# Altium footprint library 04.连接器件.pcb.PCBLIB: 363 footprints (part 21 of 23)
Each footprint in its own frame and in the unit in brackets; x right, y up, seen from the top. Pads: shape width x height; smd on the part's side, far side on the other; paste and mask are expansions set on the pad; w line width, h text height; cw(c..) or ccw(c..) is an arc to the next point about the centre after c.
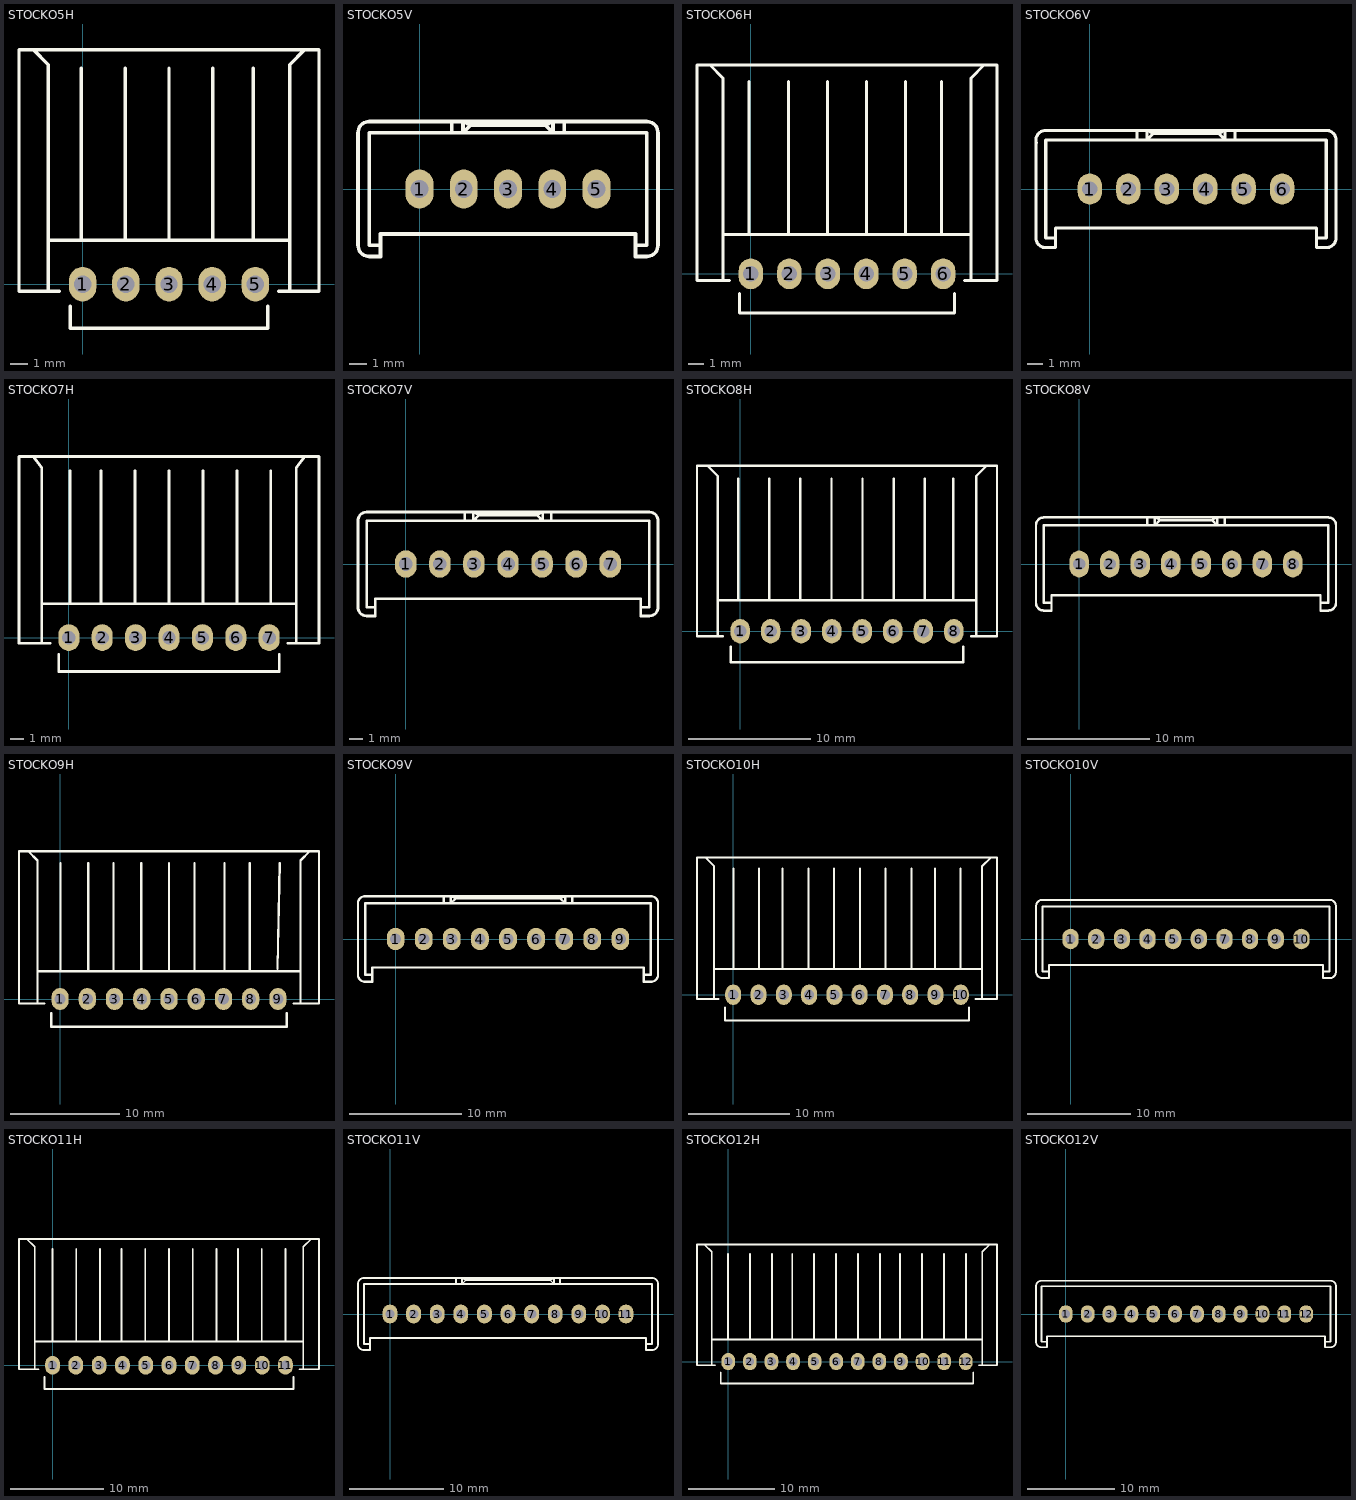
[diagram p20: the footprints below, top view; thin cyan lines are the x and y axes]

## STOCKO5H [mm]
pads (5):
  oval 1.575x2 hole 1: 1(0,0) 2(2.498,0) 3(4.995,0) 4(7.493,0) 5(9.991,0)
TopOverlay:
  lines w0.2: -2.836,13.547 -1.99,12.7 -1.99,-0.423 ; -1.99,2.54 11.98,2.54 ; -1.355,-0.423 -3.683,-0.423 -3.683,13.547 13.674,13.547 13.674,-0.423 11.345,-0.423 ; -0.72,-1.27 -0.72,-2.54 10.71,-2.54 10.71,-1.27 ; -0.085,2.54 -0.085,12.488 ; 2.455,2.54 2.455,12.488 ; 4.995,2.54 4.995,12.488 ; 7.535,2.54 7.535,12.488 ; 9.864,2.54 9.864,12.488 ; 11.98,-0.423 11.98,12.7 12.827,13.547

## STOCKO5V [mm]
pads (5):
  oval 1.575x2.2 hole 1: 1(0,0) 2(2.498,0) 3(4.995,0) 4(7.493,0) 5(9.991,0)
TopOverlay:
  lines w0.2: -2.201,-3.175 -2.836,-3.175 -2.836,3.175 12.827,3.175 12.827,-3.175 12.192,-3.175 ; 1.82,3.175 1.82,3.81 ; 8.17,3.175 8.17,3.81 ; 2.879,3.598 2.455,3.175 2.455,3.81 2.879,3.598 ; 2.879,3.598 7.112,3.598 ; 7.112,3.598 7.535,3.175 7.535,3.81 7.112,3.598 ; -3.471,-3.175 ccw(c-2.836,-3.175) -2.836,-3.81 -2.201,-3.81 -2.201,-2.54 12.192,-2.54 12.192,-3.81 12.827,-3.81 ccw(c12.827,-3.175) 13.462,-3.175 13.462,3.175 ccw(c12.827,3.175) 12.827,3.81 -2.836,3.81 ccw(c-2.836,3.175) -3.471,3.175 -3.471,-3.175

## STOCKO6H [mm]
pads (6):
  oval 1.575x2 hole 1: 1(0,0) 2(2.498,0) 3(4.995,0) 4(7.493,0) 5(9.991,0) 6(12.488,0)
TopOverlay:
  lines w0.2: -2.646,13.547 -1.799,12.7 -1.799,-0.423 ; -1.799,2.54 14.287,2.54 ; -1.376,-0.423 -3.492,-0.423 -3.492,13.547 15.981,13.547 15.981,-0.423 13.864,-0.423 ; -0.741,-1.27 -0.741,-2.54 13.229,-2.54 13.229,-1.27 ; -0.106,2.54 -0.106,12.488 ; 2.434,2.54 2.434,12.488 ; 4.974,2.54 4.974,12.488 ; 7.514,2.54 7.514,12.488 ; 10.054,2.54 10.054,12.488 ; 12.382,2.54 12.382,12.488 ; 14.287,-0.423 14.287,12.7 15.134,13.547

## STOCKO6V [mm]
pads (6):
  oval 1.575x2 hole 1: 1(0,0) 2(2.498,0) 3(4.995,0) 4(7.493,0) 5(9.991,0) 6(12.488,0)
TopOverlay:
  lines w0.2: -3.492,3.175 -3.492,-3.175 ccw(c-2.857,-3.175) -2.857,-3.81 -2.222,-3.81 -2.222,-2.54 14.711,-2.54 14.711,-3.81 15.346,-3.81 ccw(c15.346,-3.175) 15.981,-3.175 15.981,3.175 ccw(c15.346,3.175) 15.346,3.81 -2.857,3.81 ccw(c-2.857,3.175) -3.461,2.979 ; -2.222,-3.175 -2.857,-3.175 -2.857,3.175 15.346,3.175 15.346,-3.175 14.711,-3.175 ; 3.069,3.175 3.069,3.81 ; 9.419,3.175 9.419,3.81 ; 4.127,3.598 3.704,3.81 3.704,3.175 4.127,3.598 ; 4.127,3.598 8.361,3.598 ; 8.361,3.598 8.784,3.81 8.784,3.175 8.361,3.598

## STOCKO7H [mm]
pads (7):
  oval 1.575x2 hole 1: 1(0,0) 2(2.498,0) 3(4.995,0) 4(7.493,0) 5(9.991,0) 6(12.488,0) 7(14.986,0)
TopOverlay:
  lines w0.2: -2.667,13.547 -2.032,12.7 -2.032,-0.423 ; -2.032,2.54 17.018,2.54 ; -1.397,-0.423 -3.725,-0.423 -3.725,13.547 18.711,13.547 18.711,-0.423 16.383,-0.423 ; -0.762,-1.27 -0.762,-2.54 15.748,-2.54 15.748,-1.27 ; 0.085,2.54 0.085,12.488 ; 2.413,2.54 2.413,12.488 ; 4.953,2.54 4.953,12.488 ; 7.493,2.54 7.493,12.488 ; 10.033,2.54 10.033,12.488 ; 12.573,2.54 12.573,12.488 ; 15.113,2.54 15.113,12.488 ; 17.018,-0.423 17.018,12.7 17.653,13.547

## STOCKO7V [mm]
pads (7):
  oval 1.575x2 hole 1: 1(0,0) 2(2.498,0) 3(4.995,0) 4(7.493,0) 5(9.991,0) 6(12.488,0) 7(14.986,0)
TopOverlay:
  lines w0.2: -2.244,-3.175 -2.879,-3.175 -2.879,3.175 17.865,3.175 17.865,-3.175 17.23,-3.175 ; 4.318,3.175 4.318,3.81 ; 10.668,3.175 10.668,3.81 ; 5.376,3.598 4.953,3.175 4.953,3.81 5.376,3.598 ; 5.376,3.598 9.61,3.598 ; 9.61,3.598 10.033,3.175 10.033,3.81 9.61,3.598 ; -3.514,-3.175 ccw(c-2.879,-3.175) -2.879,-3.81 -2.244,-3.81 -2.244,-2.54 17.23,-2.54 17.23,-3.81 17.865,-3.81 ccw(c17.865,-3.175) 18.5,-3.175 18.5,3.175 ccw(c17.865,3.175) 17.865,3.81 -2.879,3.81 ccw(c-2.879,3.175) -3.514,3.175 -3.514,-3.175

## STOCKO8H [mm]
pads (8):
  oval 1.575x2 hole 1: 1(0,0) 2(2.498,0) 3(4.995,0) 4(7.493,0) 5(9.991,0) 6(12.488,0) 7(14.986,0) 8(17.484,0)
TopOverlay:
  lines w0.2: -2.688,13.547 -1.841,12.7 -1.841,-0.423 ; -1.841,2.54 19.325,2.54 ; -1.418,-0.423 -3.535,-0.423 -3.535,13.547 21.018,13.547 21.018,-0.423 18.902,-0.423 ; -0.783,-1.27 -0.783,-2.54 18.267,-2.54 18.267,-1.27 ; -0.148,2.54 -0.148,12.488 ; 2.392,2.54 2.392,12.488 ; 4.932,2.54 4.932,12.488 ; 7.472,2.54 7.472,12.488 ; 10.012,2.54 10.012,12.488 ; 12.552,2.54 12.552,12.488 ; 15.092,2.54 15.092,12.488 ; 17.42,2.54 17.42,12.488 ; 19.325,-0.423 19.325,12.7 20.172,13.547

## STOCKO8V [mm]
pads (8):
  oval 1.575x2.2 hole 1: 1(0,0) 2(2.498,0) 3(4.995,0) 4(7.493,0) 5(9.991,0) 6(12.488,0) 7(14.986,0) 8(17.484,0)
TopOverlay:
  lines w0.2: -2.265,-3.175 -2.9,-3.175 -2.9,3.175 20.383,3.175 20.383,-3.175 19.748,-3.175 ; 5.567,3.175 5.567,3.81 ; 11.917,3.175 11.917,3.81 ; 6.625,3.598 6.202,3.81 6.202,3.175 6.625,3.598 ; 6.625,3.598 10.858,3.598 ; 10.858,3.598 11.282,3.81 11.282,3.175 10.858,3.598 ; -3.535,-3.175 ccw(c-2.9,-3.175) -2.9,-3.81 -2.265,-3.81 -2.265,-2.54 19.748,-2.54 19.748,-3.81 20.383,-3.81 ccw(c20.383,-3.175) 21.018,-3.175 21.018,3.175 ccw(c20.383,3.175) 20.383,3.81 -2.9,3.81 ccw(c-2.9,3.175) -3.535,3.175 -3.535,-3.175

## STOCKO9H [mm]
pads (9):
  oval 1.575x2 hole 1: 1(0,0) 2(2.498,0) 3(4.995,0) 4(7.493,0) 5(9.991,0) 6(12.488,0) 7(14.986,0) 8(17.484,0) 9(19.981,0)
TopOverlay:
  lines w0.2: -2.921,13.547 -2.074,12.7 -2.074,-0.423 ; -2.074,2.54 22.056,2.54 ; -1.439,-0.423 -3.768,-0.423 -3.768,13.547 23.749,13.547 23.749,-0.423 21.421,-0.423 ; -0.804,-1.27 -0.804,-2.54 20.786,-2.54 20.786,-1.27 ; 0.042,2.54 0.042,12.488 ; 2.582,2.54 2.582,12.488 ; 4.911,2.54 4.911,12.488 ; 7.451,2.54 7.451,12.488 ; 9.991,2.54 9.991,12.488 ; 12.319,2.54 12.319,12.488 ; 15.071,2.54 15.071,12.488 ; 17.399,2.54 17.399,12.488 ; 19.939,2.752 20.151,12.488 ; 22.056,-0.423 22.056,12.7 22.902,13.547

## STOCKO9V [mm]
pads (9):
  oval 1.575x2 hole 1: 1(0,0) 2(2.498,0) 3(4.995,0) 4(7.493,0) 5(9.991,0) 6(12.488,0) 7(14.986,0) 8(17.484,0) 9(19.981,0)
TopOverlay:
  lines w0.2: -2.074,-3.175 -2.709,-3.175 -2.709,3.175 22.691,3.175 22.691,-3.175 22.056,-3.175 ; 4.276,3.175 4.276,3.81 ; 15.706,3.175 15.706,3.81 ; 5.334,3.598 4.911,3.81 4.911,3.175 5.334,3.598 ; 5.334,3.598 14.647,3.598 ; 14.647,3.598 15.071,3.81 15.071,3.175 14.647,3.598 ; -3.344,-3.175 ccw(c-2.709,-3.175) -2.709,-3.81 -2.074,-3.81 -2.074,-2.54 22.056,-2.54 22.056,-3.81 22.691,-3.81 ccw(c22.691,-3.175) 23.326,-3.175 23.326,3.175 ccw(c22.691,3.175) 22.691,3.81 -2.709,3.81 ccw(c-2.709,3.175) -3.344,3.175 -3.344,-3.175

## STOCKO10H [mm]
pads (10):
  oval 1.575x2 hole 1: 1(0,0) 2(2.498,0) 3(4.995,0) 4(7.493,0) 5(9.991,0) 6(12.488,0) 7(14.986,0) 8(17.484,0) 9(19.981,0) 10(22.479,0)
TopOverlay:
  lines w0.2: -2.73,13.547 -1.884,12.7 -1.884,-0.423 ; -1.884,2.54 24.575,2.54 ; -1.46,-0.423 -3.577,-0.423 -3.577,13.547 26.056,13.547 26.056,-0.423 23.939,-0.423 ; -0.826,-1.27 -0.826,-2.54 23.304,-2.54 23.304,-1.27 ; 0.021,2.54 0.021,12.488 ; 2.561,2.54 2.561,12.488 ; 4.889,2.54 4.889,12.488 ; 7.429,2.54 7.429,12.488 ; 9.97,2.54 9.97,12.488 ; 12.509,2.54 12.509,12.488 ; 15.05,2.54 15.05,12.488 ; 17.59,2.54 17.59,12.488 ; 19.918,2.54 19.918,12.488 ; 22.458,2.54 22.458,12.488 ; 24.575,-0.423 24.575,12.7 25.421,13.547

## STOCKO10V [mm]
pads (10):
  oval 1.575x2 hole 1: 1(0,0) 2(2.498,0) 3(4.995,0) 4(7.493,0) 5(9.991,0) 6(12.488,0) 7(14.986,0) 8(17.484,0) 9(19.981,0) 10(22.479,0)
TopOverlay:
  lines w0.2: -2.73,-3.81 -2.095,-3.81 -2.095,-2.54 24.575,-2.54 24.575,-3.81 25.209,-3.81 ccw(c25.209,-3.175) 25.845,-3.175 25.845,3.175 ccw(c25.209,3.175) 25.209,3.81 -2.73,3.81 ccw(c-2.73,3.175) -3.365,3.175 -3.365,-3.175 ccw(c-2.73,-3.175) -2.534,-3.779 ; -2.095,-3.175 -2.73,-3.175 -2.73,3.175 25.209,3.175 25.209,-3.175 24.575,-3.175

## STOCKO11H [mm]
pads (11):
  oval 1.575x2 hole 1: 1(0,0) 2(2.498,0) 3(4.995,0) 4(7.493,0) 5(9.991,0) 6(12.488,0) 7(14.986,0) 8(17.484,0) 9(19.981,0) 10(22.479,0) 11(24.977,0)
TopOverlay:
  lines w0.2: -2.752,13.547 -1.905,12.7 -1.905,-0.423 ; -1.905,2.54 26.882,2.54 ; -1.482,-0.423 -3.598,-0.423 -3.598,13.547 28.575,13.547 28.575,-0.423 26.458,-0.423 ; -0.847,-1.27 -0.847,-2.54 25.823,-2.54 25.823,-1.27 ; 0,2.54 0,12.488 ; 2.54,2.54 2.54,12.488 ; 5.08,2.54 5.08,12.488 ; 7.408,2.54 7.408,12.488 ; 9.948,2.54 9.948,12.488 ; 12.488,2.54 12.488,12.488 ; 15.028,2.54 15.028,12.488 ; 17.568,2.54 17.568,12.488 ; 19.897,2.54 19.897,12.488 ; 22.437,2.54 22.437,12.488 ; 24.977,2.54 24.977,12.488 ; 26.882,-0.423 26.882,12.7 27.728,13.547

## STOCKO11V [mm]
pads (11):
  oval 1.575x2 hole 1: 1(0,0) 2(2.498,0) 3(4.995,0) 4(7.493,0) 5(9.991,0) 6(12.488,0) 7(14.986,0) 8(17.484,0) 9(19.981,0) 10(22.479,0) 11(24.977,0)
TopOverlay:
  lines w0.2: -2.117,-3.175 -2.752,-3.175 -2.752,3.175 27.728,3.175 27.728,-3.175 27.093,-3.175 ; 6.985,3.175 6.985,3.81 ; 17.992,3.175 17.992,3.81 ; 8.043,3.598 7.62,3.81 7.62,3.175 8.043,3.598 ; 8.043,3.598 16.933,3.598 ; 16.933,3.598 17.357,3.81 17.357,3.175 16.933,3.598 ; -3.387,-3.175 ccw(c-2.752,-3.175) -2.752,-3.81 -2.117,-3.81 -2.117,-2.54 27.093,-2.54 27.093,-3.81 27.728,-3.81 ccw(c27.728,-3.175) 28.363,-3.175 28.363,3.175 ccw(c27.728,3.175) 27.728,3.81 -2.752,3.81 ccw(c-2.752,3.175) -3.387,3.175 -3.387,-3.175

## STOCKO12H [mm]
pads (12):
  oval 1.575x2 hole 1: 1(0,0) 2(2.498,0) 3(4.995,0) 4(7.493,0) 5(9.991,0) 6(12.488,0) 7(14.986,0) 8(17.484,0) 9(19.981,0) 10(22.479,0) 11(24.977,0) 12(27.474,0)
TopOverlay:
  lines w0.2: -2.773,13.547 -1.926,12.7 -1.926,-0.423 ; -1.926,2.54 29.4,2.54 ; -1.503,-0.423 -3.619,-0.423 -3.619,13.547 31.094,13.547 31.094,-0.423 28.977,-0.423 ; -0.868,-1.27 -0.868,-2.54 28.342,-2.54 28.342,-1.27 ; -0.021,2.54 -0.021,12.488 ; 2.519,2.54 2.519,12.488 ; 5.059,2.54 5.059,12.488 ; 7.387,2.54 7.387,12.488 ; 9.927,2.54 9.927,12.488 ; 12.467,2.54 12.467,12.488 ; 15.007,2.54 15.007,12.488 ; 17.547,2.54 17.547,12.488 ; 19.875,2.54 19.875,12.488 ; 22.415,2.54 22.415,12.488 ; 24.955,2.54 24.955,12.488 ; 27.495,2.54 27.495,12.488 ; 29.4,-0.423 29.4,12.7 30.247,13.547

## STOCKO12V [mm]
pads (12):
  oval 1.575x2 hole 1: 1(0,0) 2(2.498,0) 3(4.995,0) 4(7.493,0) 5(9.991,0) 6(12.488,0) 7(14.986,0) 8(17.484,0) 9(19.981,0) 10(22.479,0) 11(24.977,0) 12(27.474,0)
TopOverlay:
  lines w0.2: -2.138,-3.175 -2.773,-3.175 -2.773,3.175 30.247,3.175 30.247,-3.175 29.612,-3.175 ; -3.408,-3.175 ccw(c-2.773,-3.175) -2.773,-3.81 -2.138,-3.81 -2.138,-2.54 29.612,-2.54 29.612,-3.81 30.247,-3.81 ccw(c30.247,-3.175) 30.882,-3.175 30.882,3.175 ccw(c30.247,3.175) 30.247,3.81 -2.773,3.81 ccw(c-2.773,3.175) -3.408,3.175 -3.408,-3.175